# Altium footprint library CeleronLib_THD.PcbLib: 217 footprints (part 9 of 14)
Each footprint in its own frame and in the unit in brackets; x right, y up, seen from the top. Pads: shape width x height; smd on the part's side, far side on the other; paste and mask are expansions set on the pad; w line width, h text height; cw(c..) or ccw(c..) is an arc to the next point about the centre after c.
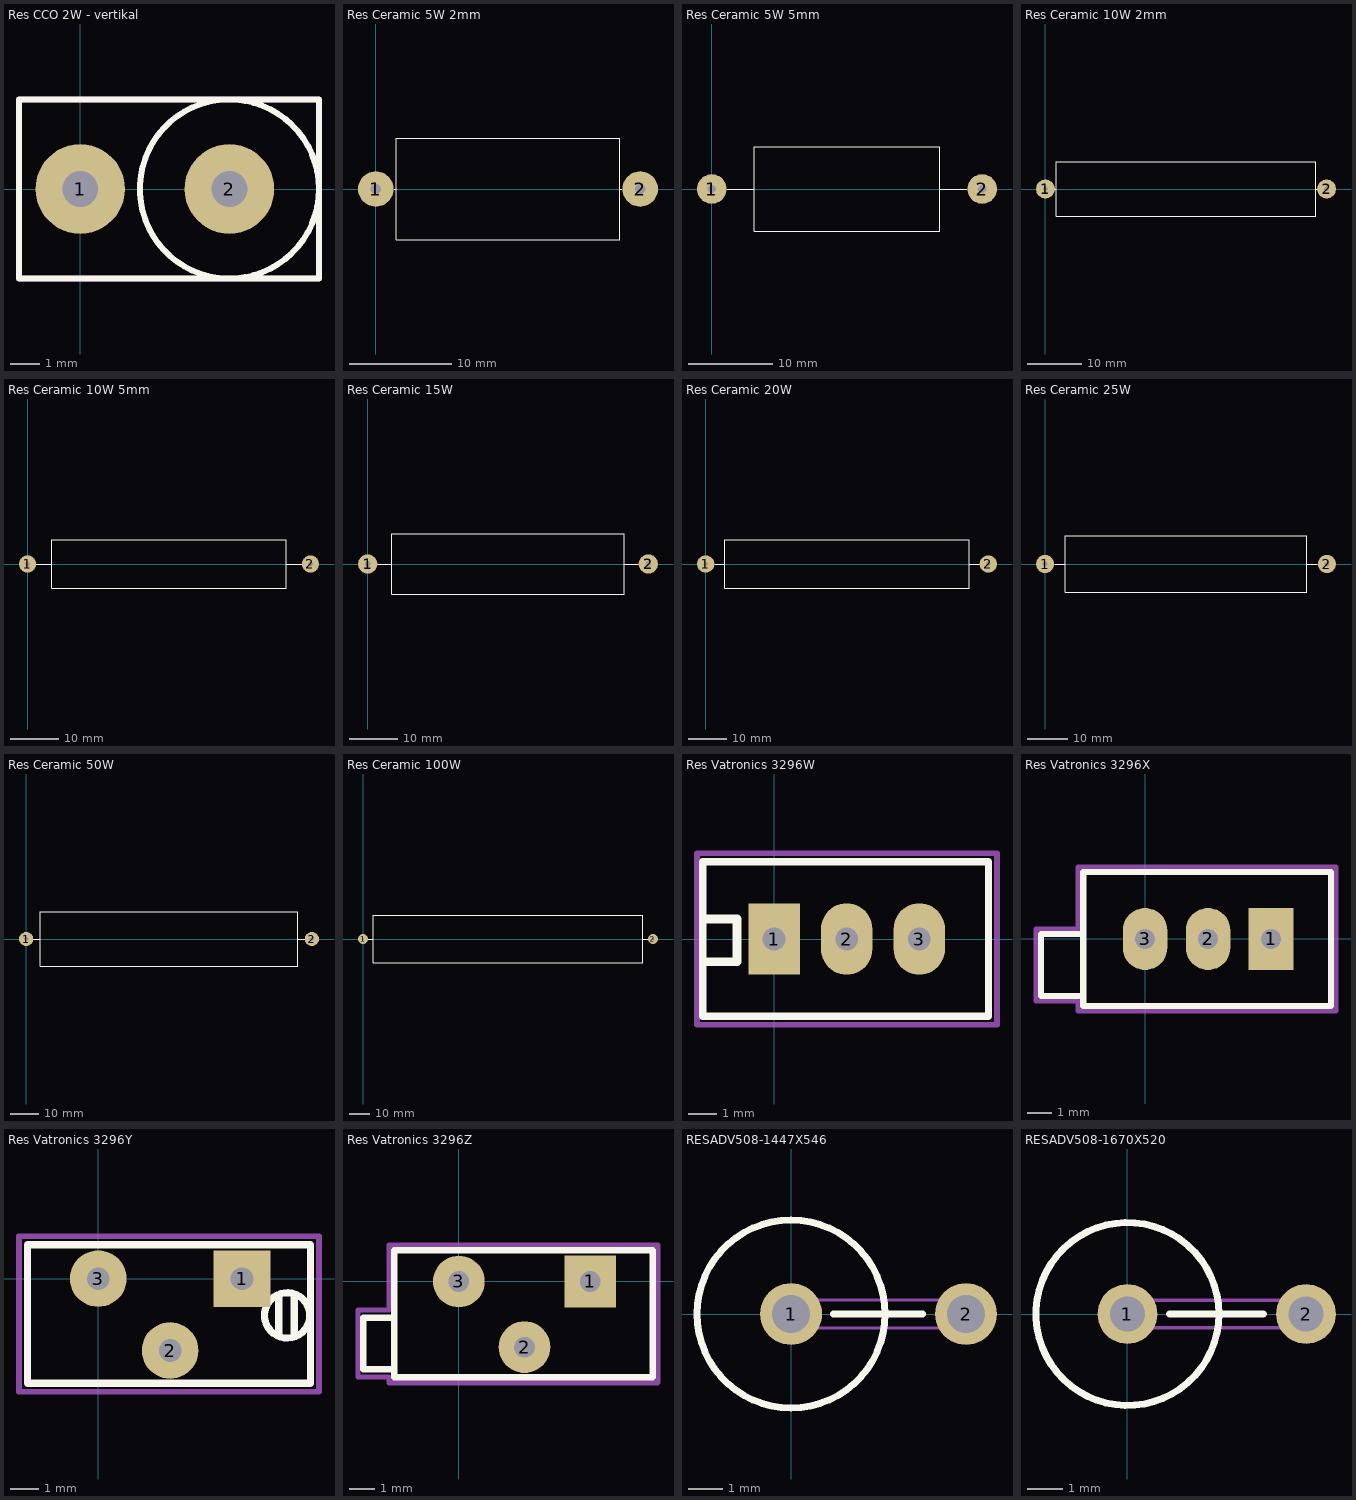
[diagram p8: the footprints below, top view; thin cyan lines are the x and y axes]

## Res CCO 2W - vertikal [mm] "Резистор СCO, выводной 6mm, L=16.0mm, l=25mm, d=0.8mm"
height 6
pads (2):
  round 3 hole 1.2: 1(0,0) 2(5,0)
Top Overlay:
  circle w0.2: c5,0 r3
  lines w0.2: -2.05,-3 -2.05,3 8,3 8,-3 -2.05,-3
Top Courtyard:
  lines w0.2: -2.05,-3 -2.05,3 8,3 8,-3 -2.05,-3
3D body: height 21.6, standoff -4, extent -0.4,-2.6 7.6,2.6

## Res Ceramic 5W 2mm [mm] "Резистор цементный"
height 9
pads (2):
  round 3.5 hole 1: 1(0,0) 2(26,0)
Top Overlay:
  lines w0.1: 1.803,0 2,0 ; 24,0 24.181,0 ; 2,-5 24,-5 24,5 2,5 2,-5
3D body: height 9.5, standoff 0.5, extent 2.001,-4.999 24,4.999

## Res Ceramic 5W 5mm [mm] "Резистор цементный"
height 9
pads (2):
  round 3.5 hole 1: 1(0,0) 2(32,0)
Top Overlay:
  lines w0.1: 1.829,0 5,0 ; 27,0 30.175,0 ; 5,-5 27,-5 27,5 5,5 5,-5
3D body: height 9.5, standoff 0.5, extent 5.001,-4.999 27,4.999

## Res Ceramic 10W 2mm [mm] "Резистор цементный"
height 9
pads (2):
  round 3.5 hole 1: 1(0,0) 2(52,0)
Top Overlay:
  lines w0.1: 1.803,0 2,0 ; 50,0 50.19,0 ; 2,-5 50,-5 50,5 2,5 2,-5
3D body: height 9.5, standoff 0.5, extent 2,-4.999 50,5

## Res Ceramic 10W 5mm [mm] "Резистор цементный"
height 9
pads (2):
  round 3.5 hole 1: 1(0,0) 2(58,0)
Top Overlay:
  lines w0.1: 1.803,0 5,0 ; 53,0 56.185,0 ; 5,-5 5,5 53,5 53,-5 5,-5
3D body: height 9.5, standoff 0.5, extent 5,-4.999 53,5

## Res Ceramic 15W [mm] "Резистор цементный"
height 12.5
pads (2):
  round 4 hole 1.2: 1(0,0) 2(58,0)
Top Overlay:
  lines w0.1: 2.057,0 5,0 ; 53,0 55.931,0 ; 5,-6.25 53,-6.25 53,6.25 5,6.25 5,-6.25
3D body: height 13, standoff 0.5, extent 5,-6.25 53,6.25

## Res Ceramic 20W [mm] "Резистор цементный"
height 12.5
pads (2):
  round 4.524 hole 1.2: 1(0,0) 2(73.5,0)
Top Overlay:
  lines w0.1: 2.337,0 5,0 ; 68.5,0 71.171,0 ; 5,-6.25 5,6.25 68.5,6.25 68.5,-6.25 5,-6.25
3D body: height 13, standoff 0.5, extent 5,-6.25 68.5,6.25

## Res Ceramic 25W [mm] "Резистор цементный"
height 14
pads (2):
  round 4.524 hole 1.2: 1(0,0) 2(70,0)
Top Overlay:
  lines w0.1: 2.337,0 5,0 ; 65,0 67.666,0 ; 5,-7 65,-7 65,7 5,7 5,-7
3D body: height 14.5, standoff 0.5, extent 5,-7 65,7

## Res Ceramic 50W [mm] "Резистор цементный"
height 19
pads (2):
  round 5 hole 1.5: 1(0,0) 2(100,0)
Top Overlay:
  lines w0.1: 2.565,0 5,0 ; 95,0 97.434,0 ; 5,-9.5 95,-9.5 95,9.5 5,9.5 5,-9.5
3D body: height 19.5, standoff 0.5, extent 5,-9.5 95,9.5

## Res Ceramic 100W [mm] "Резистор цементный"
height 24
pads (2):
  round 5 hole 1.5: 1(0,0) 2(145,0)
Top Overlay:
  lines w0.1: 2.591,0 5,0 ; 140,0 142.418,0 ; 5,-12 5,12 140,12 140,-12 5,-12
3D body: height 24.5, standoff 0.5, extent 5,-12 140,12

## Res Vatronics 3296W [mm] "Винт сверху"
height 10
pads (3):
  rect 1.8x2.5 hole 0.8: 1(0,0)
  oval 1.8x2.5 hole 0.8: 2(2.54,0) 3(5.08,0)
Top Overlay:
  lines w0.254: -2.5,-2.7 -2.5,2.7 7.5,2.7 7.5,-2.7 -2.5,-2.7
  lines w0.3: -2.4,-0.8 -1.3,-0.8 -1.3,0.7 -2.4,0.7
Top Courtyard:
  lines w0.2: -2.7,-3 7.8,-3 7.8,3 -2.7,3 -2.7,-3
3D body: height 11.55, standoff -1.6, extent -2.265,-2.4 7.265,2.4

## Res Vatronics 3296X [mm] "Винт сбоку"
height 10
pads (3):
  rect 1.8x2.5 hole 0.8: 1(5.08,0)
  oval 1.8x2.5 hole 0.8: 2(2.54,0) 3(0,0)
Top Overlay:
  lines w0.254: -2.5,-2.3 -4.2,-2.3 -4.2,0.2 -2.5,0.2 ; -2.5,-2.7 7.5,-2.7 7.5,2.7 -2.5,2.7 -2.5,-2.7
Top Courtyard:
  lines w0.2: -4.4,-2.5 -4.4,0.4 -2.7,0.4 -2.7,2.9 7.7,2.9 7.7,-2.9 -2.7,-2.9 -2.7,-2.5 -4.4,-2.5
3D body: height 10.03, standoff -1.6, extent -3.725,-2.4 7.305,2.4

## Res Vatronics 3296Y [mm] "Винт сверху"
height 10
pads (3):
  rect 2x2 hole 0.8: 1(5.08,0)
  round 2 hole 0.8: 2(2.54,-2.54) 3(0,0)
Top Overlay:
  circle w0.254: c6.675,-1.3 r0.8
  lines w0.254: -2.5,-2.5 -2.5,1 ; 6.375,-2 6.375,-0.6 ; 6.925,-2 6.925,-0.55 ; 7.5,-2.5 7.5,1.2 -2.5,1.2 -2.5,-3.7 7.5,-3.7 7.5,1
Top Courtyard:
  lines w0.2: -2.8,-4 -2.8,1.5 7.8,1.5 7.8,-4 -2.8,-4
3D body: height 11.55, standoff -2.1, extent -2.225,-3.65 7.305,1.15

## Res Vatronics 3296Z [mm] "Винт сбоку"
height 10
pads (3):
  rect 2x2 hole 0.8: 1(5.08,0)
  round 2 hole 0.8: 2(2.54,-2.54) 3(0,0)
Top Overlay:
  lines w0.254: -2.5,-1.4 -3.7,-1.4 -3.7,-3.4 -2.5,-3.4 -2.5,1 ; 7.5,-2.5 7.5,1 ; -2.5,-3.7 -2.5,1.2 7.5,1.2 7.5,-3.7 -2.5,-3.7
Top Courtyard:
  lines w0.2: 7.681,-3.919 -2.7,-3.919 -2.7,-3.7 -3.9,-3.7 -3.9,-1.1 -2.7,-1.1 -2.7,1.4 7.7,1.4 7.7,-3.9
3D body: height 10.03, standoff -1.6, extent -3.665,-3.7 7.365,1.1

## RESADV508-1447X546 [mm] "Resistor, Axial, Vertical Mount, Pad spacing 5.08mm - Body Lengh 14.22mm X Body Diameter 5.46mm"
height 17.2
pads (2):
  round 1.8 hole 1.1: 1(0,0) 2(5.08,0)
Top Overlay:
  circle w0.2: c0,0 r2.73
  lines w0.2: 1.225,0 3.825,0
Mechanical 8:
  lines w0.1: -0.5,0 0,0 ; 0,-0.5 0,0 ; 0,0.5 0,0 ; 0.5,0 0,0 ; 4.58,0 5.08,0 ; 5.08,-0.5 5.08,0 ; 5.08,0.5 5.08,0 ; 5.58,0 5.08,0
Top Assy:
  lines w0.1: 2.7,-0.406 cw(c0,0) 2.7,0.407 ; 0,0.406 ccw(c0,0) 0.017,-0.406 5.08,-0.406 ccw(c5.08,0) 5.08,0.406 0,0.406
3D body: height 17.17, standoff -3.8, extent -2.73,-2.73 5.487,2.73

## RESADV508-1670X520 [mm] "Resistor, Axial, Vertical Mount, Lead spacing 5.08 mm - Body Lengh 16.7mm X Body Diameter 5.2mm"
height 23.6
pads (2):
  round 1.7 hole 1: 1(0,0) 2(5.08,0)
Top Overlay:
  circle w0.2: c0,0 r2.6
  lines w0.2: 1.2,0 3.875,0
Mechanical 8:
  lines w0.1: -0.5,0 0,0 ; 0,-0.5 0,0 ; 0,0.5 0,0 ; 0.5,0 0,0 ; 4.58,0 5.08,0 ; 5.08,-0.5 5.08,0 ; 5.08,0.5 5.08,0 ; 5.58,0 5.08,0
Top Assy:
  lines w0.1: 2.571,-0.39 cw(c0,0) 2.571,0.39 ; 0,-0.39 cw(c0,0) 0,0.39 5.08,0.39 cw(c5.08,0) 5.08,-0.39 0,-0.39
3D body: height 23.6, standoff -3.7, extent -2.6,-2.6 5.47,2.6